# Altium footprint library Dip Switch.PcbLib: 39 footprints (part 1 of 3)
Each footprint in its own frame and in the unit in brackets; x right, y up, seen from the top. Pads: shape width x height; smd on the part's side, far side on the other; paste and mask are expansions set on the pad; w line width, h text height; cw(c..) or ccw(c..) is an arc to the next point about the centre after c.
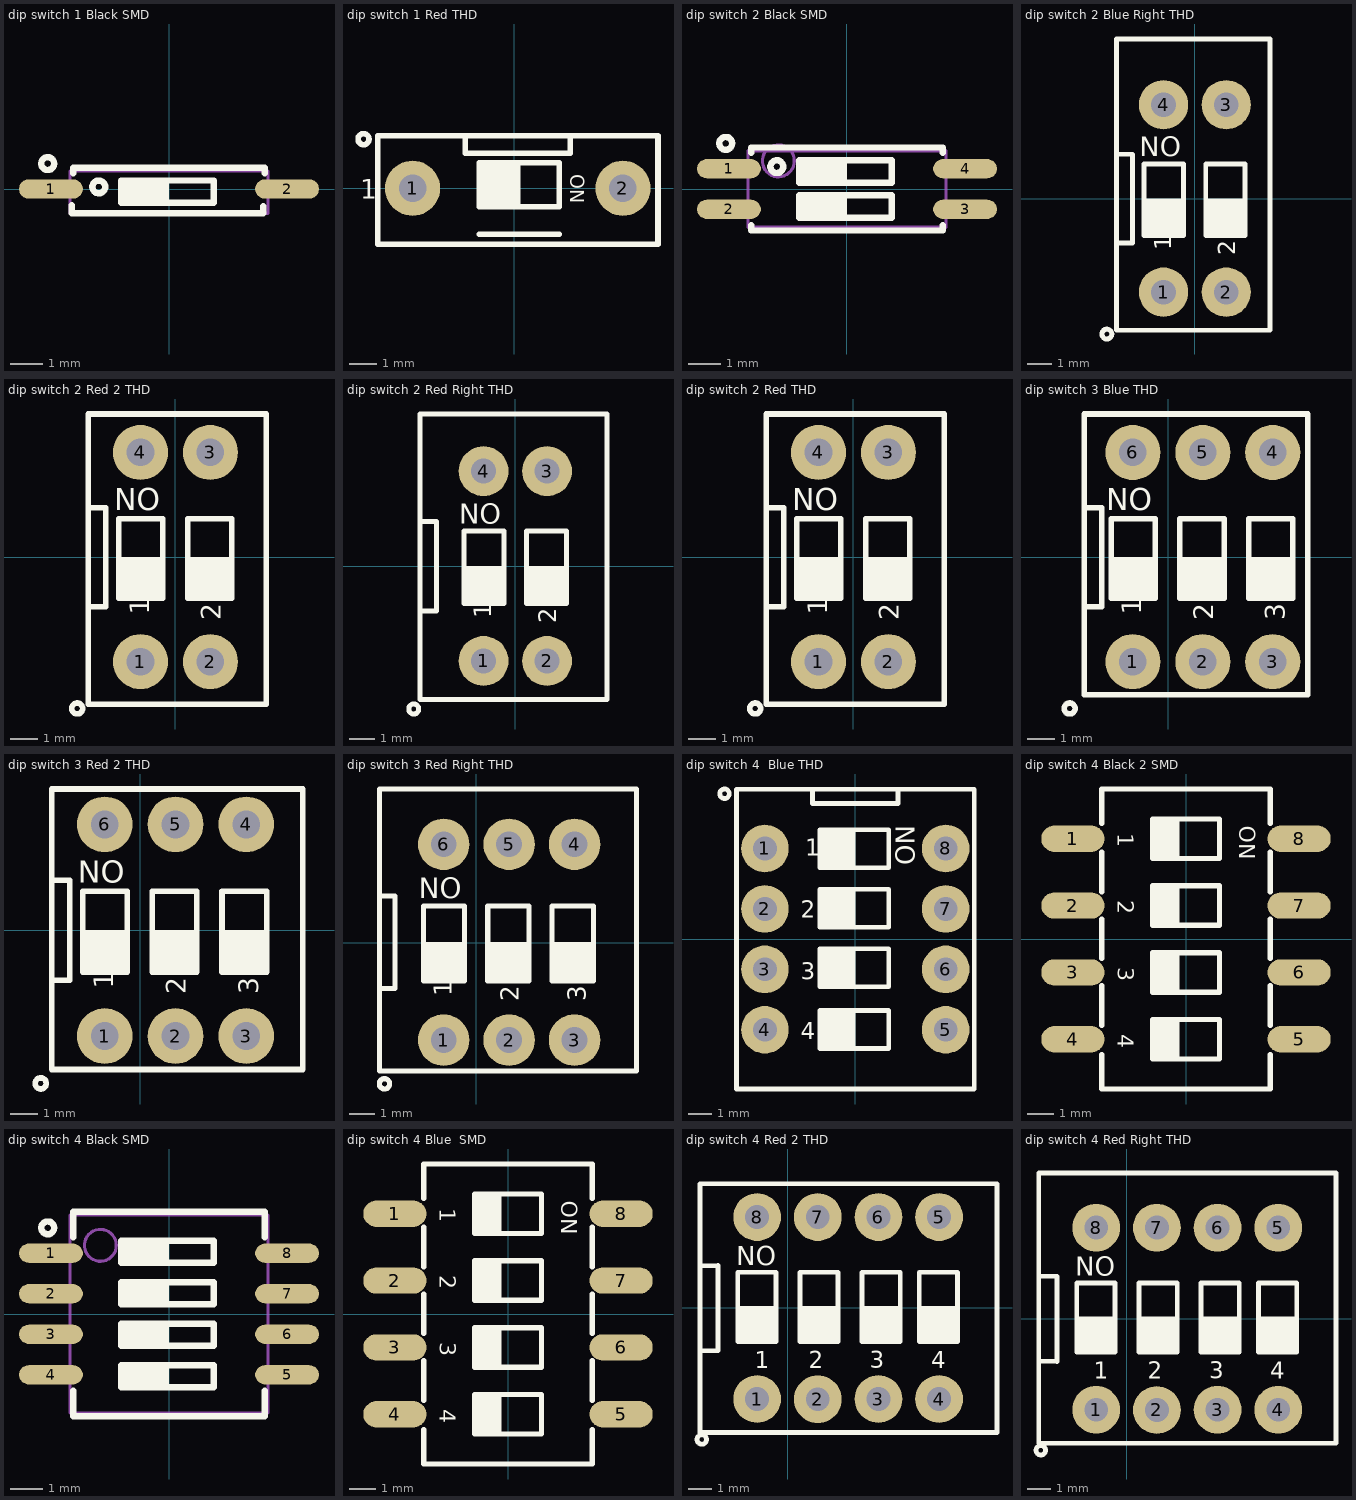
[diagram p0: the footprints below, top view; thin cyan lines are the x and y axes]

## dip switch 1 Black SMD [mm] "SWITCH DIP 12POS, THD, 2.54mm"
pads (2):
  oval 2x0.6 smd: 1(-3.7,0) 2(3.7,0)
Top Overlay:
  circle w0.2: c-2.2,0.065 r0.2
  circle w0.2: c-3.8,0.795 r0.2
  rectangle: -1.5,-0.435 0,0.165
  lines w0.2: -3.048,-0.508 -3.048,-0.762 2.952,-0.762 2.952,-0.539 ; -3,0.495 -3,0.665 3,0.665 3,0.495 ; -1.5,-0.435 -1.5,0.265 1.4,0.265 1.4,-0.435 -1.5,-0.435
Mechanical 13:
  lines w0.1: -3.1,-0.762 -3.1,0.565 3.1,0.565 3.1,-0.762 -3.1,-0.762
3D body "User Library-SMD DIP Switch 1x.step": height 4.15, standoff 0, extent -4.95,-2.005 4.95,2.005

## dip switch 1 Red THD [mm] "SWITCH DIP 12POS, THD, 2.54mm"
pads (2):
  round 2 / inner round 1.4 / far side round 2 hole 1: 1(-3.683,0) 2(3.937,0)
Top Overlay:
  circle w0.2: c-5.461,1.778 r0.2
  rectangle: -1.273,-0.67 0.227,0.93
  lines w0.2: -1.783,1.778 -1.783,1.27 2.027,1.27 2.027,1.905 ; -1.273,-1.67 1.627,-1.67 ; -4.953,-2.032 -4.953,1.905 5.207,1.905 5.207,-2.032 -4.953,-2.032 ; -1.273,-0.67 1.627,-0.67 1.627,0.93 -1.273,0.93 -1.273,-0.67
  text "1" at -5.588,-0.381 h0.7
  text "ON" at 2.032,0.508 h0.51
3D body "User Library-DIP_1 (2).step": height 6.82, standoff -3.65, extent -4.873,-2.095 5.127,1.905

## dip switch 2 Black SMD [mm] "SWITCH DIP 2POS, SMD, 1.27mm, 6.1X2.4mm  TDA series"
height 2.3
pads (4):
  oval 2x0.6 smd: 1(-3.7,0.635) 2(-3.7,-0.635) 3(3.7,-0.635) 4(3.7,0.635)
Top Overlay:
  circle w0.2: c-2.2,0.7 r0.2
  circle w0.2: c-3.8,1.43 r0.2
  rectangle: -1.5,0.2 0,0.8
  rectangle: -1.5,-0.8 0,-0.2
  lines w0.2: -3,-1.13 -3,-1.3 3,-1.3 3,-1.13 ; -3,1.13 -3,1.3 3,1.3 3,1.13 ; -1.5,-0.9 1.4,-0.9 1.4,-0.2 -1.5,-0.2 -1.5,-0.9 ; -1.5,0.2 -1.5,0.9 1.4,0.9 1.4,0.2 -1.5,0.2
Mechanical 13:
  circle w0.1: c-2.15,0.88 r0.5
  lines w0.1: -3.1,-1.2 -3.1,1.2 3.1,1.2 3.1,-1.2 -3.1,-1.2
3D body "218-2polesLP.STP": height 2.57, standoff -0.05, extent -4.22,-1.855 4.22,1.855

## dip switch 2 Blue Right THD [mm]
height 6.5
pads (4):
  round 2 / inner round 1.4 / far side round 2 hole 1 mask+0.1: 1(-1.27,-3.787) 2(1.27,-3.787) 3(1.27,3.813) 4(-1.27,3.813)
Top Overlay:
  circle w0.2: c-3.57,-5.487 r0.2
  region: 2.04,-1.487 2.04,0.013 0.44,0.013 0.44,-1.487
  region: -0.46,-1.487 -0.46,0.013 -2.06,0.013 -2.06,-1.487
  lines w0.2: -3.125,-1.787 -2.525,-1.787 -2.525,1.803 -3.125,1.803 ; -3.175,-5.332 -3.175,6.477 3.048,6.477 3.048,-5.332 -3.175,-5.332 ; -2.06,-1.487 -0.46,-1.487 -0.46,1.413 -2.06,1.413 -2.06,-1.487 ; 0.44,-1.487 0.44,1.413 2.04,1.413 2.04,-1.487 0.44,-1.487
  text "2" at 1.64,-2.287 h0.7
  text "1" at -0.96,-2.087 h0.7
  text "ON" at -0.56,2.513 h0.8
3D body "User Library-Switch-Piano-DIP-2.step": height 9, standoff -4, extent -3.048,-5.04 2.952,6.31

## dip switch 2 Red 2 THD [mm]
height 6.5
pads (4):
  round 2 / inner round 1.4 / far side round 2 hole 1 mask+0.1: 1(-1.269,-3.786) 2(1.271,-3.786) 3(1.271,3.814) 4(-1.269,3.814)
Top Overlay:
  circle w0.2: c-3.569,-5.486 r0.2
  region: -0.459,-1.486 -0.459,0.014 -2.059,0.014 -2.059,-1.486
  region: 2.041,-1.486 2.041,0.014 0.441,0.014 0.441,-1.486
  lines w0.2: -3.124,-1.786 -2.524,-1.786 -2.524,1.804 -3.124,1.804 ; -3.174,-5.331 3.301,-5.331 3.301,5.21 -3.174,5.21 -3.174,-5.331 ; -2.059,-1.486 -2.059,1.414 -0.459,1.414 -0.459,-1.486 -2.059,-1.486 ; 0.441,-1.486 2.041,-1.486 2.041,1.414 0.441,1.414 0.441,-1.486
  text "ON" at -0.559,2.514 h0.8
  text "1" at -0.959,-2.086 h0.7
  text "2" at 1.641,-2.286 h0.7
3D body "User Library-DS1040-02 (DIP_switch).step": height 6.8, standoff -3.85, extent -3.27,-4.95 3.27,4.95

## dip switch 2 Red Right THD [mm]
height 6.5
pads (4):
  round 2 / inner round 1.4 / far side round 2 hole 1 mask+0.1: 1(-1.268,-3.791) 2(1.272,-3.791) 3(1.272,3.809) 4(-1.268,3.809)
Top Overlay:
  circle w0.2: c-4.064,-5.715 r0.2
  region: 2.042,-1.491 2.042,0.009 0.442,0.009 0.442,-1.491
  region: -0.458,-1.491 -0.458,0.009 -2.058,0.009 -2.058,-1.491
  lines w0.2: -3.758,-1.791 -3.158,-1.791 -3.158,1.799 -3.758,1.799 ; -3.81,-5.336 -3.81,6.096 3.683,6.096 3.683,-5.336 -3.81,-5.336 ; -2.058,-1.491 -0.458,-1.491 -0.458,1.409 -2.058,1.409 -2.058,-1.491 ; 0.442,-1.491 0.442,1.409 2.042,1.409 2.042,-1.491 0.442,-1.491
  text "2" at 1.642,-2.291 h0.7
  text "1" at -0.958,-2.091 h0.7
  text "ON" at -0.558,2.509 h0.8
3D body "User Library-DIP SW 2P TH RA.step": height 7.9, standoff -3.8, extent -3.683,-4.952 3.577,5.968

## dip switch 2 Red THD [mm]
height 6.5
pads (4):
  round 2 / inner round 1.4 / far side round 2 hole 1 mask+0.1: 1(-1.269,-3.789) 2(1.271,-3.789) 3(1.271,3.811) 4(-1.269,3.811)
Top Overlay:
  circle w0.2: c-3.569,-5.489 r0.2
  region: 2.041,-1.489 2.041,0.011 0.441,0.011 0.441,-1.489
  region: -0.459,-1.489 -0.459,0.011 -2.059,0.011 -2.059,-1.489
  lines w0.2: -3.124,-1.789 -2.524,-1.789 -2.524,1.801 -3.124,1.801 ; -3.174,-5.334 -3.174,5.207 3.302,5.207 3.302,-5.334 -3.174,-5.334 ; -2.059,-1.489 -0.459,-1.489 -0.459,1.411 -2.059,1.411 -2.059,-1.489 ; 0.441,-1.489 0.441,1.411 2.041,1.411 2.041,-1.489 0.441,-1.489
  text "2" at 1.641,-2.289 h0.7
  text "1" at -0.959,-2.089 h0.7
  text "ON" at -0.559,2.511 h0.8
3D body "dip2.STEP": height 6.91, standoff -1.79, extent -3.25,-5.03 3.25,4.97

## dip switch 3 Blue THD [mm]
height 6.5
pads (6):
  round 2 / inner round 1.4 / far side round 2 hole 1 mask+0.1: 1(-1.278,-3.79) 2(1.262,-3.79) 3(3.802,-3.79) 4(3.802,3.81) 5(1.262,3.81) 6(-1.278,3.81)
Top Overlay:
  circle w0.2: c-3.578,-5.49 r0.2
  region: 4.532,-1.49 4.532,0.01 2.932,0.01 2.932,-1.49
  region: 2.032,-1.49 2.032,0.01 0.432,0.01 0.432,-1.49
  region: -0.468,-1.49 -0.468,0.01 -2.068,0.01 -2.068,-1.49
  lines w0.2: -3.006,-1.79 -2.406,-1.79 -2.406,1.8 -3.006,1.8 ; -3.048,-4.99 -3.048,5.207 5.08,5.207 5.08,-4.99 -3.048,-4.99 ; -2.068,-1.49 -0.468,-1.49 -0.468,1.41 -2.068,1.41 -2.068,-1.49 ; 0.432,-1.49 0.432,1.41 2.032,1.41 2.032,-1.49 0.432,-1.49 ; 2.932,-1.49 2.932,1.41 4.532,1.41 4.532,-1.49 2.932,-1.49
  text "3" at 4.232,-2.29 h0.7
  text "2" at 1.632,-2.29 h0.7
  text "1" at -0.968,-2.09 h0.7
  text "ON" at -0.568,2.51 h0.8
3D body "User Library-switch 3.step": height 7, standoff -3.7, extent -3.051,-4.947 5.083,4.953

## dip switch 3 Red 2 THD [mm]
height 6.5
pads (6):
  round 2 / inner round 1.4 / far side round 2 hole 1 mask+0.1: 1(-1.271,-3.79) 2(1.269,-3.79) 3(3.809,-3.79) 4(3.809,3.81) 5(1.269,3.81) 6(-1.271,3.81)
Top Overlay:
  circle w0.2: c-3.571,-5.49 r0.2
  region: 4.539,-1.49 4.539,0.01 2.939,0.01 2.939,-1.49
  region: 2.039,-1.49 2.039,0.01 0.439,0.01 0.439,-1.49
  region: -0.461,-1.49 -0.461,0.01 -2.061,0.01 -2.061,-1.49
  lines w0.2: -3.126,-1.79 -2.526,-1.79 -2.526,1.8 -3.126,1.8 ; -3.175,-4.99 -3.175,5.08 5.842,5.08 5.842,-4.99 -3.175,-4.99 ; -2.061,-1.49 -0.461,-1.49 -0.461,1.41 -2.061,1.41 -2.061,-1.49 ; 0.439,-1.49 0.439,1.41 2.039,1.41 2.039,-1.49 0.439,-1.49 ; 2.939,-1.49 2.939,1.41 4.539,1.41 4.539,-1.49 2.939,-1.49
  text "3" at 4.239,-2.29 h0.7
  text "2" at 1.639,-2.29 h0.7
  text "1" at -0.961,-2.09 h0.7
  text "ON" at -0.561,2.51 h0.8
3D body "User Library-DS1040-03 (DIP_switch).step": height 6.8, standoff -3.85, extent -3.27,-4.95 5.81,4.95

## dip switch 3 Red Right THD [mm]
height 6.5
pads (6):
  round 2 / inner round 1.4 / far side round 2 hole 1 mask+0.1: 1(-1.271,-3.78) 2(1.269,-3.78) 3(3.809,-3.78) 4(3.809,3.82) 5(1.269,3.82) 6(-1.271,3.82)
Top Overlay:
  circle w0.2: c-3.571,-5.48 r0.2
  region: 4.539,-1.48 4.539,0.02 2.939,0.02 2.939,-1.48
  region: 2.039,-1.48 2.039,0.02 0.439,0.02 0.439,-1.48
  region: -0.461,-1.48 -0.461,0.02 -2.061,0.02 -2.061,-1.48
  lines w0.2: -3.761,-1.78 -3.161,-1.78 -3.161,1.81 -3.761,1.81 ; -3.761,-4.98 -3.761,5.969 6.222,5.969 6.222,-4.98 -3.761,-4.98 ; -2.061,-1.48 -0.461,-1.48 -0.461,1.42 -2.061,1.42 -2.061,-1.48 ; 0.439,-1.48 0.439,1.42 2.039,1.42 2.039,-1.48 0.439,-1.48 ; 2.939,-1.48 2.939,1.42 4.539,1.42 4.539,-1.48 2.939,-1.48
  text "3" at 4.239,-2.28 h0.7
  text "2" at 1.639,-2.28 h0.7
  text "1" at -0.961,-2.08 h0.7
  text "ON" at -0.561,2.52 h0.8
3D body "User Library-DIP SW 3P TH RA (1).step": height 7.9, standoff -3.8, extent -3.63,-4.89 6.17,6.03

## dip switch 4  Blue THD [mm] "SWITCH DIP 4POS, THD, 2.54mm, YL04"
height 6.5
pads (8):
  round 2 / inner round 1.4 / far side round 2 hole 1 mask+0.1: 1(-3.8,3.81) 2(-3.8,1.27) 3(-3.8,-1.27) 4(-3.8,-3.81) 5(3.8,-3.81) 6(3.8,-1.27) 7(3.8,1.27) 8(3.8,3.81)
Top Overlay:
  circle w0.2: c-5.5,6.11 r0.2
  rectangle: -1.5,3 0,4.6
  rectangle: -1.5,0.5 0,2.1
  rectangle: -1.5,-2 0,-0.4
  rectangle: -1.5,-4.6 0,-3
  lines w0.2: -1.8,6.3 -1.8,5.7 1.79,5.7 1.79,6.3 ; -5,-6.3 -5,6.3 5,6.3 5,-6.3 -5,-6.3 ; -1.5,-4.6 -1.5,-3 1.4,-3 1.4,-4.6 -1.5,-4.6 ; -1.5,-2 -1.5,-0.4 1.4,-0.4 1.4,-2 -1.5,-2 ; -1.5,0.5 -1.5,2.1 1.4,2.1 1.4,0.5 -1.5,0.5 ; -1.5,3 1.4,3 1.4,4.6 -1.5,4.6 -1.5,3
  text "ON" at 2.5,3.1 h0.8
  text "1" at -2.1,3.5 h0.7
  text "2" at -2.3,0.9 h0.7
  text "3" at -2.3,-1.7 h0.7
  text "4" at -2.3,-4.2 h0.7
3D body "User Library-DIP SWITCH 4 POS CTS 206.step": height 8.14, standoff -3.5, extent -4.89,-6.17 4.89,6.17

## dip switch 4 Black 2 SMD [mm] "SWITCH DIP 4POS, SMD, 2.54mm, CTS-219-04"
pads (8):
  oval 2.4x1 smd: 1(-4.3,3.81) 2(-4.3,1.27) 3(-4.3,-1.27) 4(-4.3,-3.81) 5(4.3,-3.81) 6(4.3,-1.27) 7(4.3,1.27) 8(4.3,3.81)
Top Overlay:
  region: -1.27,4.56 -1.27,3.06 -0.254,3.06 -0.254,4.56
  region: -1.27,2.02 -1.27,0.52 -0.254,0.52 -0.254,2.02
  region: -1.27,-0.52 -1.27,-2.02 -0.254,-2.02 -0.254,-0.52
  region: -1.27,-3.06 -1.27,-4.56 -0.254,-4.56 -0.254,-3.06
  lines w0.2: -3.2,-4.4 -3.2,-5.7 3.2,-5.7 3.2,-4.4 ; -3.2,-3.28 -3.2,-1.78 ; -3.2,-0.74 -3.2,0.76 ; -3.2,1.8 -3.2,3.3 ; -3.2,4.4 -3.2,5.7 3.2,5.7 3.2,4.4 ; 3.2,-3.28 3.2,-1.78 ; 3.2,-0.74 3.2,0.76 ; 3.2,1.8 3.2,3.3 ; -1.27,-4.56 -1.27,-3.06 1.27,-3.06 1.27,-4.56 -1.27,-4.56 ; -1.27,-2.02 -1.27,-0.52 1.27,-0.52 1.27,-2.02 -1.27,-2.02 ; -1.27,0.52 -1.27,2.02 1.27,2.02 1.27,0.52 -1.27,0.52 ; -1.27,3.06 -1.27,4.56 1.27,4.56 1.27,3.06 -1.27,3.06
  text "ON" at 2.021,4.31 h0.61
  text "1" at -2.596,4.01 h0.61
  text "2" at -2.596,1.47 h0.61
  text "3" at -2.596,-1.07 h0.61
  text "4" at -2.596,-3.61 h0.61
3D body "User Library-DM04V.step": height 4.52, standoff 0, extent -4.89,-5.55 4.89,5.55

## dip switch 4 Black SMD [mm] "SWITCH DIP 4POS, SMD, 1.27mm, 6.1X6.2mm , TDA series"
height 2.3
pads (8):
  oval 2x0.6 smd: 1(-3.7,1.905) 2(-3.7,0.635) 3(-3.7,-0.635) 4(-3.7,-1.905) 5(3.7,-1.905) 6(3.7,-0.635) 7(3.7,0.635) 8(3.7,1.905)
Top Overlay:
  circle w0.2: c-3.8,2.7 r0.2
  rectangle: -1.5,1.651 0,2.3
  rectangle: -1.5,0.381 0,1
  rectangle: -1.5,-1.016 0,-0.3
  rectangle: -1.5,-2.286 0,-1.6
  lines w0.2: -3,-2.4 -3,-3.2 3,-3.2 3,-2.4 ; -3,2.4 -3,3.2 3,3.2 3,2.4 ; -1.5,-2.3 1.4,-2.3 1.4,-1.6 -1.5,-1.6 -1.5,-2.3 ; -1.5,-1 1.4,-1 1.4,-0.3 -1.5,-0.3 -1.5,-1 ; -1.5,0.3 1.4,0.3 1.4,1 -1.5,1 -1.5,0.3 ; -1.5,1.6 1.4,1.6 1.4,2.3 -1.5,2.3 -1.5,1.6
Mechanical 13:
  circle w0.1: c-2.15,2.15 r0.5
  lines w0.1: -3.1,-3.1 3.1,-3.1 3.1,3.1 -3.1,3.1 -3.1,-3.1
3D body "218-4polesLP.STP": height 2.57, standoff -0.05, extent -4.22,-3.125 4.22,3.125

## dip switch 4 Blue  SMD [mm] "SWITCH DIP 4POS, SMD, 2.54mm, CTS-219-04"
pads (8):
  oval 2.4x1 smd: 1(-4.3,3.81) 2(-4.3,1.27) 3(-4.3,-1.27) 4(-4.3,-3.81) 5(4.3,-3.81) 6(4.3,-1.27) 7(4.3,1.27) 8(4.3,3.81)
Top Overlay:
  region: -1.27,-3.06 -1.27,-4.56 -0.254,-4.56 -0.254,-3.06
  region: -1.27,-0.52 -1.27,-2.02 -0.254,-2.02 -0.254,-0.52
  region: -1.27,2.02 -1.27,0.52 -0.254,0.52 -0.254,2.02
  region: -1.27,4.56 -1.27,3.06 -0.254,3.06 -0.254,4.56
  lines w0.2: -3.2,-4.4 -3.2,-5.7 3.2,-5.7 3.2,-4.4 ; -3.2,-3.28 -3.2,-1.78 ; -3.2,-0.74 -3.2,0.76 ; -3.2,1.8 -3.2,3.3 ; -3.2,4.4 -3.2,5.7 3.2,5.7 3.2,4.4 ; 3.2,-3.28 3.2,-1.78 ; 3.2,-0.74 3.2,0.76 ; 3.2,1.8 3.2,3.3 ; -1.27,-4.56 1.27,-4.56 1.27,-3.06 -1.27,-3.06 -1.27,-4.56 ; -1.27,-2.02 1.27,-2.02 1.27,-0.52 -1.27,-0.52 -1.27,-2.02 ; -1.27,0.52 1.27,0.52 1.27,2.02 -1.27,2.02 -1.27,0.52 ; -1.27,3.06 1.27,3.06 1.27,4.56 -1.27,4.56 -1.27,3.06
  text "4" at -2.596,-3.61 h0.61
  text "3" at -2.596,-1.07 h0.61
  text "2" at -2.596,1.47 h0.61
  text "1" at -2.596,4.01 h0.61
  text "ON" at 2.021,4.31 h0.61
3D body "User Library-CTS 219-4MST DIP switch bank x1.step": height 4.27, standoff 0, extent -4.955,-5.788 4.955,5.842

## dip switch 4 Red 2 THD [mm]
height 6.5
pads (8):
  round 2 / inner round 1.4 / far side round 2 hole 1: 1(-1.283,-3.813) 2(1.257,-3.823) 3(3.797,-3.813) 4(6.337,-3.813) 5(6.337,3.807) 6(3.797,3.807) 7(1.257,3.807) 8(-1.283,3.807)
Top Overlay:
  circle w0.2: c-3.603,-5.508 r0.2
  region: -0.493,-1.408 -0.493,0.092 -2.093,0.092 -2.093,-1.408
  region: 2.107,-1.408 2.107,0.092 0.507,0.092 0.507,-1.408
  region: 4.707,-1.408 4.707,0.092 3.107,0.092 3.107,-1.408
  region: 7.107,-1.408 7.107,0.092 5.507,0.092 5.507,-1.408
  lines w0.2: -3.637,-1.781 -2.923,-1.79 ; -3.637,1.775 -2.923,1.766 ; -2.923,-1.781 -2.923,1.775 ; -3.683,-5.215 -3.683,5.204 8.763,5.204 8.763,-5.215 -3.683,-5.215 ; -2.093,-1.408 -0.493,-1.408 -0.493,1.492 -2.093,1.492 -2.093,-1.408 ; 0.507,-1.408 2.107,-1.408 2.107,1.492 0.507,1.492 0.507,-1.408 ; 3.107,-1.408 4.707,-1.408 4.707,1.492 3.107,1.492 3.107,-1.408 ; 5.507,-1.408 7.107,-1.408 7.107,1.492 5.507,1.492 5.507,-1.408
  text "ON" at -0.493,2.592 h0.8
  text "1" at -1.384,-2.518 h0.7
  text "2" at 0.88,-2.518 h0.7
  text "3" at 3.44,-2.518 h0.7
  text "4" at 6.001,-2.518 h0.7
3D body "User Library-DIP SW 4P TH.step": height 3.8, standoff -8.5, extent -3.67,-5.017 8.75,4.763

## dip switch 4 Red Right THD [mm]
height 6.5
pads (8):
  round 2 / inner round 1.4 / far side round 2 hole 1: 1(-1.274,-3.813) 2(1.266,-3.823) 3(3.806,-3.813) 4(6.346,-3.813) 5(6.346,3.807) 6(3.806,3.807) 7(1.266,3.807) 8(-1.274,3.807)
Top Overlay:
  circle w0.2: c-3.594,-5.508 r0.2
  region: 7.116,-1.408 7.116,0.092 5.516,0.092 5.516,-1.408
  region: 4.716,-1.408 4.716,0.092 3.116,0.092 3.116,-1.408
  region: 2.116,-1.408 2.116,0.092 0.516,0.092 0.516,-1.408
  region: -0.484,-1.408 -0.484,0.092 -2.084,0.092 -2.084,-1.408
  lines w0.2: -3.628,-1.781 -2.914,-1.79 ; -3.628,1.775 -2.914,1.766 ; -2.914,-1.781 -2.914,1.775 ; -3.683,-5.215 8.763,-5.215 8.763,6.096 -3.683,6.096 -3.683,-5.215 ; -2.084,-1.408 -2.084,1.492 -0.484,1.492 -0.484,-1.408 -2.084,-1.408 ; 0.516,-1.408 0.516,1.492 2.116,1.492 2.116,-1.408 0.516,-1.408 ; 3.116,-1.408 3.116,1.492 4.716,1.492 4.716,-1.408 3.116,-1.408 ; 5.516,-1.408 5.516,1.492 7.116,1.492 7.116,-1.408 5.516,-1.408
  text "4" at 6.01,-2.518 h0.7
  text "3" at 3.449,-2.518 h0.7
  text "2" at 0.889,-2.518 h0.7
  text "1" at -1.375,-2.518 h0.7
  text "ON" at -0.484,2.592 h0.8
3D body "User Library-DIP SW 4P TH RA.step": height 7.9, standoff -3.8, extent -3.63,-4.89 8.71,6.03